# Altium integrated library EDD.IntLib: 140 symbols
Pins are listed as number, name and electrical type; pins without a type are passive.

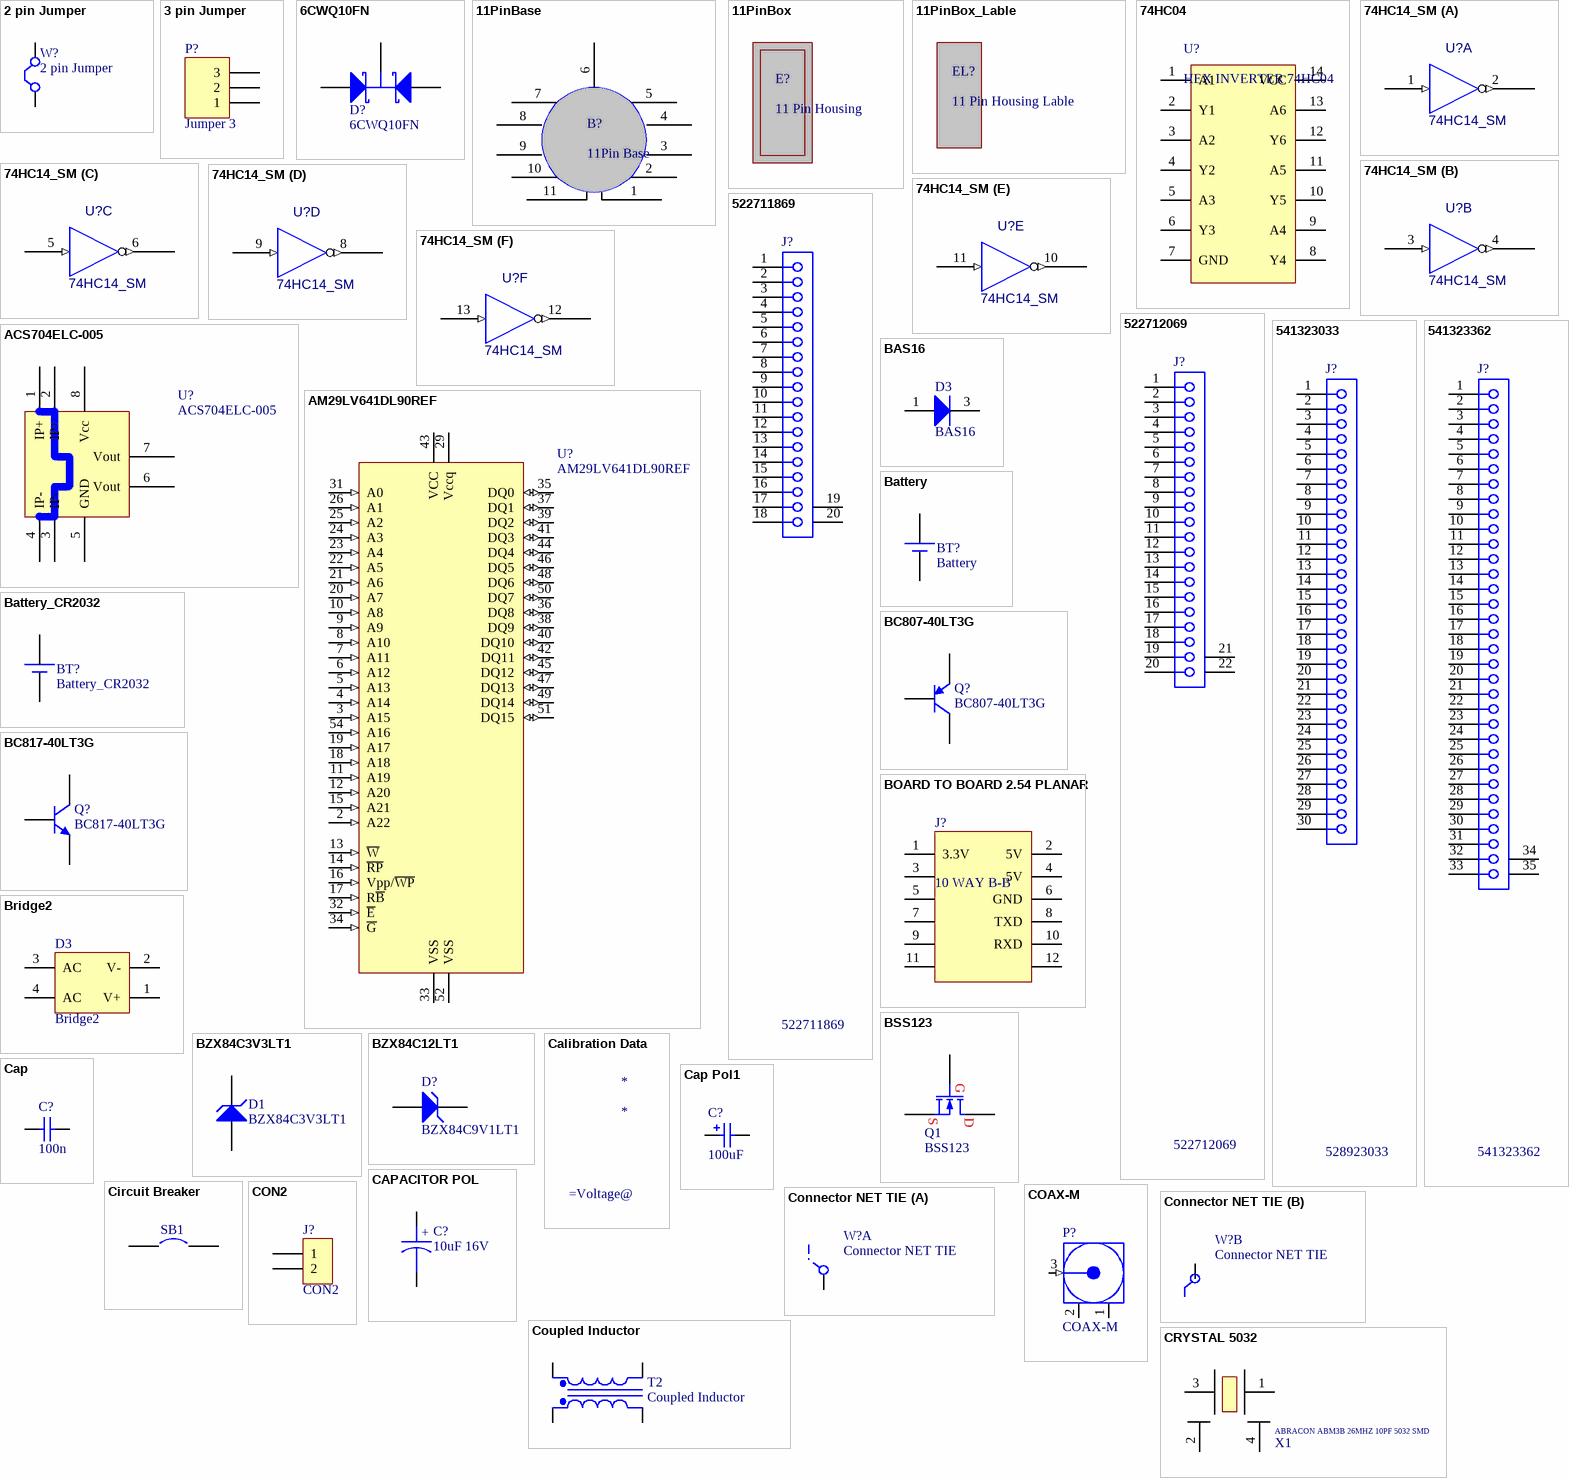
[diagram p0: symbols 2 pin Jumper to CRYSTAL 5032]

## 2 pin Jumper
designator W?
Jumper, 2 pin; Published: 24-Mar-1999; LatestRevisionDate: 17-Jul-2002; LatestRevisionNote: Re-released for DXP Platform.; PackageReference: RAD-0.2; Publisher: Altium Limited
footprint DDPAK-EB3_L (D2-PAK, 4-Leads, Body 9x10.2mm, Pitch 2.54mm, Lead Span 14.9mm, IPC High Density)
footprint 2 pin Jumper (Connector; Header; 2 Position)
pins: 1 C1, 2 C2

## 3 pin Jumper
designator P?, comment Jumper 3
Jumper, 3-Pin; LatestRevisionDate: 17-Jul-2002; LatestRevisionNote: Re-released for DXP Platform.; Publisher: Altium Limited
footprint 3 pin Jumper (Footprint not found)
signal-integrity model Connector
pins: 1, 2, 3

## 6CWQ10FN
designator D?
Schottky Rectifier; Note: Pin 2 is trimmed and not drawn; Published: 17-Sep-2003; DatasheetVersion: May-2002; PackageVersion: Feb-2003; PackageReference: TO-252AA; Publisher: Altium Limited; PackageDescription: 3-Pin HEXFET Package 2.28 mm Pitch, 9.9 mm Lead Span; Code_JEDEC: TO-252-AA; ComponentLink1Description: Manufacturer Link; ComponentLink1URL: http://www.irf.com/; ComponentLink2Description: Datasheet; ComponentLink2URL: http://www.irf.com/product-info/datasheets/data/6CWQ10FN.pdf
footprint TO-252AA_N (D-PAK, 4-Leads, Body 6.1x6.5mm, Pitch 2.28mm, Lead Span 9.9mm, IPC Medium Density)
footprint TO-252AA_L (D-PAK, 4-Leads, Body 6.1x6.5mm, Pitch 2.28mm, Lead Span 9.9mm, IPC High Density)
footprint TO-252AA_M (D-PAK, 4-Leads, Body 6.1x6.5mm, Pitch 2.28mm, Lead Span 9.9mm, IPC Low Density)
simulation model 6CWQ10FN (SUBCKT)
pins: 1 A1, 3 A2, 4 K

## 11PinBase
designator B?, comment 11Pin Base  (mechanical)
footprint 11PinBase (Footprint not found)
pins: 1, 2, 3, 4, 5, 6, 7, 8, 9, 10, 11

## 11PinBox
designator E?, comment 11 Pin Housing  (mechanical)
IsEnclosure: 1

## 11PinBox_Lable
designator EL?, comment 11 Pin Housing Lable  (mechanical)
InEnclosure: 1

## 74HC04
designator U?, comment HEX INVERTER 74HC04
HEX INVERTER
footprint SOIC14
pins: 1 A1 (oc), 2 Y1 (power), 3 A2 (power), 4 Y2 (power), 5 A3 (power), 6 Y3 (power), 7 GND (power), 8 Y4, 9 A4, 10 Y5 (power), 11 A5 (power), 12 Y6, 13 A6, 14 VCC

## 74HC14_SM
designator U?
Value: *
footprint QFN50P393X393X90_HS-17N (Footprint not found)
pins on every part: 7 GND (power) hidden to GND, 14 VCC (power) hidden to VCC
part A pins: 1 A (in), 2 Y (out)
part B pins: 3 A (in), 4 Y (out)
part C pins: 5 A (in), 6 Y (out)
part D pins: 8 Y (out), 9 A (in)
part E pins: 10 Y (out), 11 A (in)
part F pins: 12 Y (out), 13 A (in)

## 522711869
designator J?
FPC/FFC Connector, Right Angle, SMT, ZIF, Bottom Contact Style, 33 Position, Pitch 0.50mm (.020"), Lead-free; PCB_Layout: Complies with manufacturer's FFC recommendation.; Published: 30-May-2008; DatasheetVersion: Aug-2006; PackageVersion: revA, Feb-2004; PackageReference: 541325097; Publisher: Altium Limited; ComponentLink1Description: Manufacturer Link; ComponentLink1URL: http://www.molex.com/; ComponentLink2Description: Datasheet; ComponentLink2URL: http://www.molex.com/pdm_docs/ps/PS-54132-058.pdf; ComponentLink3Description: Packaging Specification; ComponentLink3URL: http://www.molex.com/pdm_docs/sd/541325097_sd.pdf
footprint 522711869 (1.00mm Pitch FFC/FPC Connector, Right Angle, SMT, ZIF, Bottom Contact Style, 18 Circuits, Lead-Free, Gold Contact Plating, High Barrier Packaging)
pins: 1, 2, 3, 4, 5, 6, 7, 8, 9, 10, 11, 12, 13, 14, 15, 16, 17, 18, 19 MH1, 20 MH2

## 522712069
designator J?
FPC/FFC Connector, Right Angle, SMT, ZIF, Bottom Contact Style, 33 Position, Pitch 0.50mm (.020"), Lead-free; PCB_Layout: Complies with manufacturer's FFC recommendation.; Published: 30-May-2008; DatasheetVersion: Aug-2006; PackageVersion: revA, Feb-2004; PackageReference: 541325097; Publisher: Altium Limited; ComponentLink1Description: Manufacturer Link; ComponentLink1URL: http://www.molex.com/; ComponentLink2Description: Datasheet; ComponentLink2URL: http://www.molex.com/pdm_docs/ps/PS-54132-058.pdf; ComponentLink3Description: Packaging Specification; ComponentLink3URL: http://www.molex.com/pdm_docs/sd/541325097_sd.pdf
signal-integrity model FPC-FFC
footprint 522712069 (1.00mm Pitch FFC/FPC Connector, Right Angle, SMT, ZIF, Bottom Contact Style, 20 Circuits, Lead-Free, Gold Contact Plating, High Barrier Packaging)
pins: 1, 2, 3, 4, 5, 6, 7, 8, 9, 10, 11, 12, 13, 14, 15, 16, 17, 18, 19, 20, 21 MH1, 22 MH2

## 541323033
designator J?, comment 528923033
FPC/FFC Connector, Right Angle, SMT, ZIF, Bottom Contact Style, 30 Position, Pitch 0.50mm (.020"), Lead-free; PCB_Layout: Complies with manufacturer's FFC recommendation.; Published: 30-May-2008; DatasheetVersion: Aug-2006; PackageVersion: revA, Feb-2004; PackageReference: 541325097; Publisher: Altium Limited; ComponentLink1Description: Manufacturer Link; ComponentLink1URL: http://www.molex.com/; ComponentLink2Description: Datasheet; ComponentLink2URL: http://www.molex.com/pdm_docs/ps/PS-54132-058.pdf; ComponentLink3Description: Packaging Specification; ComponentLink3URL: http://www.molex.com/pdm_docs/sd/541325097_sd.pdf
footprint 541323362 (Connector; FPC/FFC, SM, 50 Position, Right Angle, Pitch 0.50mm, Body 30.5x5.0mm (LxW), Bottom Contacts)
signal-integrity model FPC-FFC
pins: 1, 2, 3, 4, 5, 6, 7, 8, 9, 10, 11, 12, 13, 14, 15, 16, 17, 18, 19, 20, 21, 22, 23, 24, 25, 26, 27, 28, 29, 30

## 541323362
designator J?
FPC/FFC Connector, Right Angle, SMT, ZIF, Bottom Contact Style, 33 Position, Pitch 0.50mm (.020"), Lead-free; PCB_Layout: Complies with manufacturer's FFC recommendation.; Published: 30-May-2008; DatasheetVersion: Aug-2006; PackageVersion: revA, Feb-2004; PackageReference: 541325097; Publisher: Altium Limited; ComponentLink1Description: Manufacturer Link; ComponentLink1URL: http://www.molex.com/; ComponentLink2Description: Datasheet; ComponentLink2URL: http://www.molex.com/pdm_docs/ps/PS-54132-058.pdf; ComponentLink3Description: Packaging Specification; ComponentLink3URL: http://www.molex.com/pdm_docs/sd/541325097_sd.pdf
footprint 541323362 (Connector; FPC/FFC, SM, 50 Position, Right Angle, Pitch 0.50mm, Body 30.5x5.0mm (LxW), Bottom Contacts)
signal-integrity model FPC-FFC
pins: 1, 2, 3, 4, 5, 6, 7, 8, 9, 10, 11, 12, 13, 14, 15, 16, 17, 18, 19, 20, 21, 22, 23, 24, 25, 26, 27, 28, 29, 30, 31, 32, 33, 34 MH1, 35 MH2

## ACS704ELC-005
designator U?
Code: Q25937
footprint SOIC8 (Footprint not found)
pins: 1 IP+, 2 IP+, 3 IP-, 4 IP-, 5 GND, 6 Vout, 7 Vout, 8 Vcc

## AM29LV641DL90REF
designator U?
64 Mb (4 M x 16) CMOS 3.0 Volt, Uniform Sector Flash Memory with VersatileI/O Control, 48-Pin TSOP, Industrial Grade, Pb-free; Published: 6-Jun-2005; LatestRevisionDate: 06-Oct-2005; LatestRevisionNote: Schematic layout and Library name changed.; DatasheetVersion: Feb-2005; PackageVersion: revAA, 10/99; PackageReference: TS048; Publisher: Altium Limited; PackageDescription: Shrink Small Outline; 48 Leads; Body Width 18.4 mm; Pitch 0.5 mm; Code_JEDEC: MO-142-DD; ComponentLink1Description: Manufacturer Link; ComponentLink1URL: http://www.spansion.com/; ComponentLink2Description: Datasheet; ComponentLink2URL: http://www.spansion.com/datasheets/22366c3.pdf
footprint TSSOP50P2000X120-56N (Footprint not found)
pins: 2 A22 (in), 3 A15 (in), 4 A14 (in), 5 A13 (in), 6 A12 (in), 7 A11 (in), 8 A10 (in), 9 A9 (in), 10 A8 (in), 11 A19 (in), 12 A20 (in), 13 ~{W} (in), 14 ~{RP} (in), 15 A21 (in), 16 Vpp/~{WP} (in), 17 R~{B} (in), 18 A18 (in), 19 A17 (in), 20 A7 (in), 21 A6 (in), 22 A5 (in), 23 A4 (in), 24 A3 (in), 25 A2 (in), 26 A1 (in), 29 Vccq (power), 31 A0 (in), 32 ~{E} (in), 33 VSS (power), 34 ~{G} (in), 35 DQ0 (io), 36 DQ8 (io), 37 DQ1 (io), 38 DQ9 (io), 39 DQ2 (io), 40 DQ10 (io), 41 DQ3 (io), 42 DQ11 (io), 43 VCC (power), 44 DQ4 (io), 45 DQ12 (io), 46 DQ5 (io), 47 DQ13 (io), 48 DQ6 (io), 49 DQ14 (io), 50 DQ7 (io), 51 DQ15 (io), 52 VSS (power), 54 A16 (in)

## BAS16
designator D3
Switching Diode; Text Field6: Pin 2 is not connected and not drawn.; Text Field7: Published 29-Sep-2000
footprint SO-G3/C2.5
pins: 1 A, 3 K

## Battery
designator BT?
Singlecell Battery; Published: 24-Mar-1999; LatestRevisionDate: 17-Jul-2002; LatestRevisionNote: Re-released for DXP Platform.; PackageReference: BAT-2; Publisher: Altium Limited
footprint BC501SM (Coin cell holder 12mm)
footprint LIR-2450 (Footprint not found)
pins: 1 +, 2 -

## Battery_CR2032
designator BT?
Singlecell Battery; Published: 24-Mar-1999; LatestRevisionDate: 17-Jul-2002; LatestRevisionNote: Re-released for DXP Platform.; PackageReference: BAT-2; Publisher: Altium Limited
footprint CR2032 Battery Holder (Footprint not found)
pins: 1 +, 2 -, 3 +

## BC807-40LT3G
designator Q?
General Purpose Transistor PNP Silicon; Published: 29-Sep-2000; LatestRevisionDate: 17-Jul-2002; LatestRevisionNote: Re-released for DXP Platform.; DatasheetVersion: 1997; PackageVersion: 1997; PackageReference: 318-08; Publisher: Altium Limited; PackageDescription: SOT-23; 3 Leads; Body 3.0 x 2.6 mm, inc. leads (LxW max); ComponentLink1Description: Manufacturer Link; ComponentLink1URL: http://www.onsemi.com/site/products/landing?taxonomyID=194; ComponentLink2Description: Datasheet; ComponentLink2URL: http://www.onsemi.com/pub/Collateral/BC856ALT1-D.PDF
footprint SO-G3/Z3.3
pins: 1 B, 2 E, 3 C

## BC817-40LT3G
designator Q?
General Purpose Transistor NPN Silicon; Published: 29-Sep-2000; LatestRevisionDate: 17-Jul-2002; LatestRevisionNote: Re-released for DXP Platform.; DatasheetVersion: 1997; PackageVersion: 1997; PackageReference: 318-08; Publisher: Altium Limited; PackageDescription: SOT-23; 3 Leads; Body 3.0 x 2.6 mm, inc. leads (LxW max); ComponentLink1Description: Manufacturer Link; ComponentLink1URL: http://www.onsemi.com/site/products/landing?taxonomyID=194; ComponentLink2Description: Datasheet; ComponentLink2URL: http://www.onsemi.com/pub/Collateral/BC846ALT1-D.PDF
footprint SO-G3/Z3.3
pins: 1 B, 2 E, 3 C

## BOARD TO BOARD 2.54 PLANAR
designator J?, comment 10 WAY B-B
Connector; Code: CON2
footprint HOUSED SOCKET 2 X 6 WAY SIL
pins: 1 3.3V, 2 5V, 3, 4 5V, 5, 6 GND, 7, 8 TXD, 9, 10 RXD, 11, 12

## Bridge2
designator D3
Diode Bridge; Published: 24-Mar-1999; LatestRevisionDate: 17-Jul-2002; LatestRevisionNote: Re-released for DXP Platform.; PackageReference: D-46_6A; Publisher: Altium Limited
footprint E-BIP-P4/X2.1 (Bridge Rectifier; 4 Terminals; Body 16.8 x 16.8 mm (typ); Pitch 10.67 mm)
simulation model BRIDGE (Spice Subcircuit)
footprint DB-1S (CFP, 4-Leads, Body 8.1x6.3mm (max), Pitch 4.66mm, IPC Medium Density)
pins: 1 V+, 2 V-, 3 AC, 4 AC

## BSS123
designator Q1
BSS123; MANTECH PART NUMBER 35M2919; Published: 8-Jun-2000; LatestRevisionDate: 17-Jul-2002; LatestRevisionNote: Re-released for DXP Platform.; PackageVersion: 1995/1996; PackageReference: E3; Publisher: Altium Limited; PackageDescription: TO, Flat Index; 3 In-Line, Axial Leads; Body Dia. 4.6mm; Lead Dia. 0.5 mm (max)
footprint SOT23
pins: 1 D, 2 G, 3 S

## BZX84C3V3LT1
designator D1
Zener Voltage Regulator Diode; Note: Pin 2 is not connected and not drawn.; Published: 29-Sep-2000; LatestRevisionDate: 17-Jul-2002; LatestRevisionNote: Re-released for DXP Platform.; PackageReference: 318-07; Publisher: Altium Limited; PackageDescription: SOT-23; 3 Leads; Body 3.0 x 2.5 mm, inc. leads (LxW max); ComponentLink1Description: Manufacturer Link; ComponentLink1URL: http://www.onsemi.com/site/products/landing?taxonomyID=194; ComponentLink2Description: Datasheet; ComponentLink2URL: http://www.onsemi.com/pub/Collateral/BZX84C2V4LT1-D.PDF
footprint SO-G3/Z3.3
pins: 1 A, 3 K

## BZX84C12LT1
designator D?, comment BZX84C9V1LT1
Zener Voltage Regulator Diode; Manufacturer: Motorola; Class: Discrete; SubClass: Diode - Zener; Note: Pin 2 is not connected and not drawn.; Code: PED680LX; Published: 29/09/2000; Publisher: Altium Hobart Technology Centre
footprint SO-G3/Z3.3 (SOT-23; 3 Leads; Body 3.0 x 2.5 mm, inc. leads (LxW max))
pins: 1 A, 3 K

## Calibration Data
designator *

## Cap
designator C?, comment 100n
Capacitor; Code: AAK338; Published: 8-Jun-2000; Revision: July-2002: Re-released for DXP Platform.; Publisher: Altium Limited
footprint 0603
footprint 1206
footprint CAPPA13-24x31.5 (Capacitor, Radial,)
footprint RAD-0.6 (Footprint not found)
footprint RAD-0.4 (Footprint not found)
footprint CAPC0402(1005)60_L (Chip Capacitor, Body 1.0x0.5mm, Height 0.6mm, IPC High Density)
footprint CAPC0402(1005)60_N (Chip Capacitor, Body 1.0x0.5mm, Height 0.6mm, IPC Medium Density)
footprint Capacitor Tant / Poly 2.54mm (Capacitor Thru Hole)
pins: 1, 2

## Cap Pol1
designator C?, comment 100uF
TAJD/100MFD/10%/10V/TANT/SMD; Unit P: 1.02; Published: 8-Jun-2000; LatestRevisionDate: 17-Jul-2002; LatestRevisionNote: Re-released for DXP Platform.; Publisher: Altium Limited; Supplier1 Code: ADB690LX; Supplier1: Avnet
footprint TC7360-2924 (Capacitor, SM Tantalum; Body 7.3 x 6.0 mm (LxW typ))
pins: 1, 2
1 alternate drawing of the same symbol

## CAPACITOR POL
designator C?, comment 10uF 16V
Capacitor; Code: ALA535
footprint Cap SMD4-5*5.5 (Rubicon 4-5*5.5)
footprint Cap SMD6.3-8*6.5 (Rubicon 6.3-8*6.5)
footprint Cap SMD8-10*10.5 - duplicate (Rubicon 8-10*10.5)
footprint Cap SMD3*5.5
footprint CAP SMD12.5*13.5
footprint RB7.6-15 (Polarized Capacitor (Radial); 2 Leads)
footprint Cap SMD6.3*8
footprint RB5-10.5 (Motor, General Kind; 2 Leads)
footprint Cap SMD8-10*10.5 (Rubicon 8-10*10.5)
footprint RB30-30
pins: 1, 2
text: +

## Circuit Breaker
designator SB1
Circuit Breaker; Published: 24-Mar-1999; Revision: July-2002: Re-released for DXP Platform.; Publisher: Altium Limited
footprint JP2_SMD
pins: 1, 2

## COAX-M
designator P?
RF Coaxial PCB Connector, MMCX; Thru-Hole, Vertical Mount Plug,  50 Ohm Impedance; PackageDocument: Rev. A, 16-Jun-1997; PCB_Layout: Complies with manufacturer's recommendation.; DrillSize: Corresponds to nominal value.; Published: 15-Jul-2004; LatestRevisionDate: 15-Jul-2004; LatestRevisionNote: Component Replaced.; DatasheetDocument: 30-May-2003; PackageReference: 908-21103; Publisher: Altium Limited; ComponentLink1Description: Manufacturer Link; ComponentLink1URL: http://www.amphenolrf.com/
footprint U.FL-R-SMT (Footprint not found)
pins: 1 GND (power), 2 GND (power), 3 Signal (in) "Signal Pin"

## CON2
designator J?
Connector; Code: CON2
footprint COUPLED INDUCTOR (Footprint not found)
pins: 1, 2

## Connector NET TIE
designator W?  (net tie)
Published: 24-Mar-1999; LatestRevisionDate: 17-Jul-2002; LatestRevisionNote: Re-released for DXP Platform.; PackageReference: RAD-0.2; Publisher: Altium Limited
footprint Connector NET TIE (Footprint not found)
part A pins: 1 C1
part B pins: 2 C2

## Coupled Inductor
designator T2
footprint Coupled Inductor
pins: 1 Sec+, 2 Pri+, 3 Pri-, 4 Sec-

## CRYSTAL 5032
designator X1, comment ABRACON ABM3B 26MHZ 10PF 5032 SMD
CRYSTAL 5032
footprint CRYSTAL 5032 (CRYSTAL xxx MHZ)
footprint CRYSTAL 3225 (Footprint not found)
pins: 1, 2, 3, 4

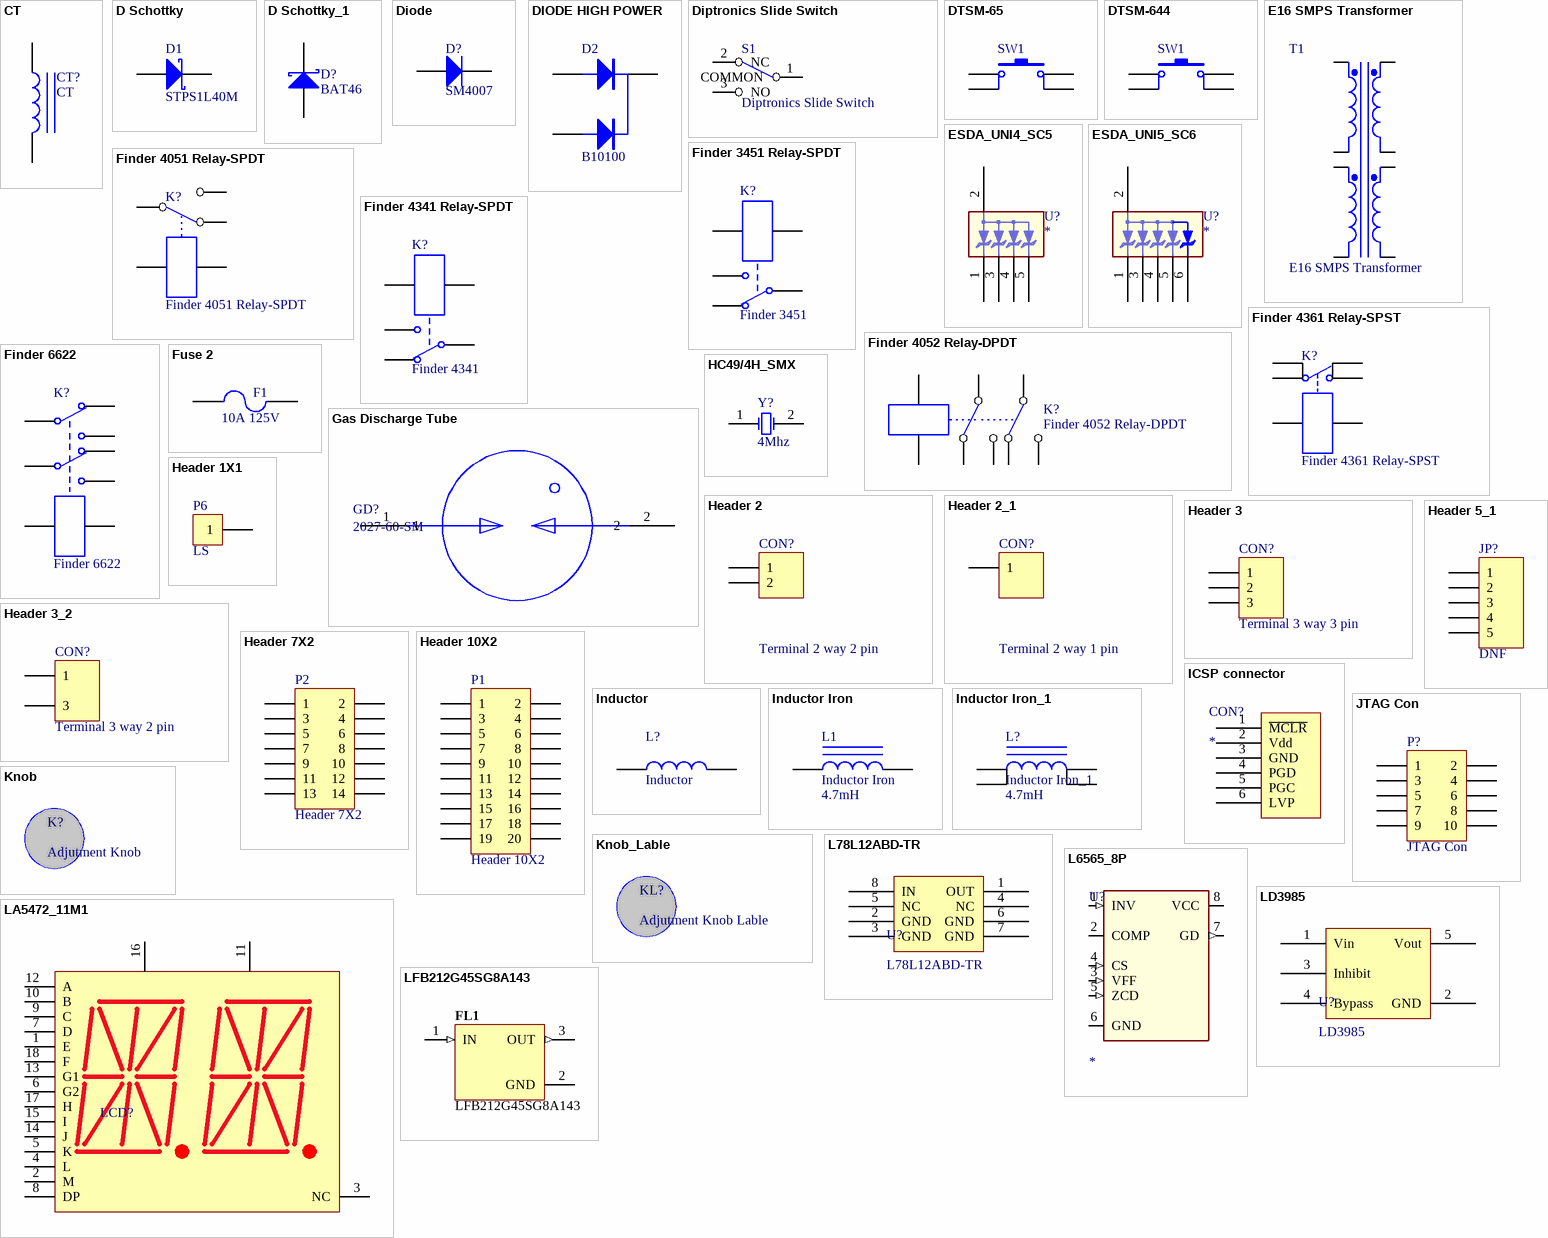
[diagram p1: symbols CT to LFB212G45SG8A143]

## CT
designator CT?
Current Transformer
footprint TC1V (Footprint not found)
pins: 1, 2

## D Schottky
designator D1, comment STPS1L40M
Schottky Diode; Published: 8-Jun-2000; LatestRevisionDate: 17-Jul-2002; LatestRevisionNote: Re-released for DXP Platform.; PackageReference: SMB; Publisher: Altium Limited; PackageDescription: DO-214-AA/SMB; 2 C-Bend Leads; Body 5.3 x 3.6 mm, inc. leads (LxW); Code_JEDEC: DO-214-AA
footprint SMB (DO-214-AA/SMB; 2 C-Bend Leads; Body 5.3 x 3.6 mm, inc. leads (LxW))
simulation model SKYDIODE (Diode)
signal-integrity model D Schottky
footprint 425
pins: 1 A, 2 K

## D Schottky_1
designator D?, comment BAT46
BAT46JFILM; Published: 8-Jun-2000; LatestRevisionDate: 17-Jul-2002; LatestRevisionNote: Re-released for DXP Platform.; PackageReference: SMB; Publisher: Altium Limited; Code_JEDEC: DO-214-AA
footprint SOD323 (Footprint not found)
footprint SOD-1323 (SOD-123 and SOD232 combined)
pins: 1 A, 2 K

## Diode
designator D?, comment SM4007
Default Diode; Code - JEDEC: DO-214-AB; Code: QBJ105; Published: 8-Jun-2000; Revision: July-2002: Re-released for DXP Platform.; Publisher: Altium Limited
footprint DSO-C2/X3.3 (DO-214-AB/SMC; 2 C-Bend Leads; Body 7.9 x 5.9 mm, inc. leads (LxW))
footprint DSO-C2/X2.3
pins: 1 A, 2 K

## DIODE HIGH POWER
designator D2, comment B10100
Diode; Part Number: SM4007; PartCategory: B; Code: QBJ105; Company Code: 0515; Long Description: RECTIFIER 1000V 1A MELF SM-1(LEAD FREE); AlternateKey2: QBJ105LX; ProductClass: SR1; BulkIssueFlag: N; WarehouseToUse: M; Unit P: 7.70; Type: SMD; Value: SM4007; Designator: D?; Stock Code: QBJ105; Price: 0.17; StockUom: EA; PriceCatewgory: A; Supplier1: Mantech; Supplier1 Code: MURHD560T4; Pin Count: 2; Footprint: DSO-C2/G1.6; PackageReference: DSO-C2/G1.6
footprint DDPAK-EB3_L (D2-PAK, 4-Leads, Body 9x10.2mm, Pitch 2.54mm, Lead Span 14.9mm, IPC High Density)
pins: 1, 2, 3

## Diptronics Slide Switch
designator S1
footprint Diptronics Slide Switch (Footprint not found)
pins: 1 COMMON, 2 NC, 3 NO

## DTSM-65
designator SW1
footprint DTSM-65 (Footprint not found)
pins: 1, 2, 3, 4

## DTSM-644
designator SW1
footprint DTSM-644 (Footprint not found)
pins: 1, 2, 3, 4

## E16 SMPS Transformer
designator T1
Three-winding Transformer (Non-Ideal); Sim Note: Enter the turns ratios, Core loss resistance, Magnetising Reactance, Leakage Reactances and Resistances referred to the primary side into the parameter fields.; Published: 25-Jan-2001; LatestRevisionDate: 17-Jul-2002; LatestRevisionNote: Re-released for DXP Platform.; PackageReference: TRF_6; Publisher: Altium Limited
footprint E16 SMPS Transformer (Footprint not found)
pins: 1 Pri+, 2 Pri-, 3 Sec3+, 4 Sec3-, 5 Sec2-, 6 Sec2+, 7 Sec1-, 8 Sec1+

## ESDA_UNI4_SC5
designator U?
ESDA6V1W6
footprint SOT323-5L (SOT23, 6-Leads, Body 2.2x2.4mm (max), Pitch 0.65mm, IPC Medium Density)
pins: 1 P1, 2 CLAMP1, 3 P2, 4 P3, 5 P4

## ESDA_UNI5_SC6
designator U?
ESDA6V1W6
footprint SOT323-6L (Footprint not found)
pins: 1 P1, 2 CLAMP1, 3 P2, 4 P3, 5 P4, 6 P5

## Finder 3451 Relay-SPDT
designator K?, comment Finder 3451
Single-Pole Dual-Throw Relay; Published: 24-Mar-1999; Revision: July-2002: Re-released for DXP Platform.; Publisher: Altium Limited
footprint Finder 3451
pins: 1, 2, 3, 4, 5

## Finder 4051 Relay-SPDT
designator K?
Single-Pole Dual-Throw Relay; Code: FR42902
footprint Finder 4051
footprint Finder3022
pins: 1, 2, 4, 6, 8

## Finder 4052 Relay-DPDT
designator K?
Double-Pole Dual-Throw Relay
footprint Finder 4052
footprint Finder3022
pins: 1, 2, 3, 4, 5, 6, 7, 8

## Finder 4341 Relay-SPDT
designator K?, comment Finder 4341
Single-Pole Dual-Throw Relay; Published: 24-Mar-1999; Revision: July-2002: Re-released for DXP Platform.; Publisher: Altium Limited
footprint Finder 4341
pins: 1, 2, 3, 4, 5

## Finder 4361 Relay-SPST
designator K?
Single-Pole Single-Throw Relay; Published: 24-Mar-1999; LatestRevisionDate: 17-Jul-2002; LatestRevisionNote: Re-released for DXP Platform.; PackageReference: MODULE4; Publisher: Altium Limited; Code: RELAY-SPST
footprint Finder 4361
pins: 1, 2, 3, 4, 5, 6

## Finder 6622
designator K?
Dual-Pole Dual-Throw Relay; Published: 24-Mar-1999; LatestRevisionDate: 17-Jul-2002; LatestRevisionNote: Re-released for DXP Platform.; PackageReference: DIP-P8; Publisher: Altium Limited
footprint Finder 6622 (Finder 6622 30A Relay)
pins: 1, 2, 3, 4, 5, 6, 7, 8, 9, 10, 11, 12, 13, 14, 15, 16

## Fuse 2
designator F1, comment 10A 125V
10A 125V Littelfuse 0251010 Fuse; Published: 8-Jun-2000; LatestRevisionDate: 17-Jul-2002; LatestRevisionNote: Re-released for DXP Platform.; PackageReference: PIN-W2/E2.8; Publisher: Altium Limited
footprint Fuse (Footprint not found)
footprint MINI BLADE FUSE (Mini Blade Fuse & Holder 7.5A)
pins: 1, 2

## Gas Discharge Tube
designator GD?, comment 2027-60-SM
footprint 2027-60-SM (Gas Discharge TUbe)
pins: 1, 2

## HC49/4H_SMX
designator Y?, comment 4Mhz
4MegaHertz Surface Mount Quartz Crystal; Note: PCB layout complies with manufacturer's recommendation.; Unit P: 1.49; Published: 17-Jul-2002; DatasheetDocument: 18-Oct-1999; PackageDocument: 18-Oct-1999; PackageReference: HC49/4H_SMX; Publisher: Altium Limited; ComponentLink1Description: Manufacturer Link; ComponentLink1URL: http://www.cmac.com/mt/; ComponentLink2Description: Datasheet; ComponentLink2URL: http://www.cmac.com/mt/databook/crystals/smd/hc49_4h_smx.pdf; Supplier1 Code: ATP580; Supplier1: Avnet
footprint HC49/4H_SMX (Surface Mount Quartz Crystal; Body 13.4 (inc. leads) x 4.9 mm (LxW max))
pins: 1 OSC1, 2 OSC2

## Header 1X1
designator P6, comment LS
Header, 1-Pin; Note: 1/20; LatestRevisionDate: 17-Jul-2002; LatestRevisionNote: Re-released for DXP Platform.; Publisher: Altium Limited; SupplierName: GM Electronic; SupplierOrderCode: 832-017 (S1G20); SupplierPrice: 3.24; SupplierPriceUnit: CZK
footprint HDR1X1 (Connector; Header; 1 Position)
3D model HDR1X1 (PCB3D Model)
footprint HDR1X1 (Footprint not found)
pins: 1

## Header 2
designator CON?, comment Terminal 2 way 2 pin
Header, 2-way, 2-Pin; Code: DNF; Revision: 17-Jul-2002: Re-released for DXP Platform.; Publisher: Altium Limited
footprint MRT20 Connector 2way
footprint POWER2
footprint 2 way Terminal 5.08mm
footprint HDR1X2 (Footprint not found)
pins: 1, 2

## Header 2_1
designator CON?, comment Terminal 2 way 1 pin
Header, 2-way, 1-Pin; Code: DNF; Revision: 17-Jul-2002: Re-released for DXP Platform.; Publisher: Altium Limited
footprint MRT20 Connector 2way 1pin
footprint POWER2
footprint 2 way Terminal 5.08mm
pins: 1

## Header 3
designator CON?, comment Terminal 3 way 3 pin
Header, 3-way, 3-Pin; Code: DNF; LatestRevisionDate: 17-Jul-2002; LatestRevisionNote: Re-released for DXP Platform.; Publisher: Altium Limited
footprint MRT20 Connector 3way
footprint Power3
footprint 3 way Terminal 5.08mm
footprint HDR1X3 (Footprint not found)
pins: 1, 2, 3

## Header 3_2
designator CON?, comment Terminal 3 way 2 pin
Header, 3-way, 2-Pin; Code: DNF; LatestRevisionDate: 17-Jul-2002; LatestRevisionNote: Re-released for DXP Platform.; Publisher: Altium Limited
footprint MRT20 Connector 3way 2pin
footprint Power3
footprint 3 way Terminal 5.08mm
pins: 1, 3

## Header 5_1
designator JP?, comment DNF
Header, 5-Pin; Revision: 17-Jul-2002: Re-released for DXP Platform.; Publisher: Altium Limited; Code: DNF
footprint TC2030-MCP_NL
footprint HDR1X5 (Connector; Header; 5 Position)
footprint MRT20 Connector 5way (Connector; Header; 5 Position)
pins: 1, 2, 3, 4, 5

## Header 7X2
designator P2
Header, 7-Pin, Dual row; LatestRevisionDate: 17-Jul-2002; LatestRevisionNote: Re-released for DXP Platform.; Publisher: Altium Limited
footprint DIP14 Connector
signal-integrity model Connector
pins: 1, 2, 3, 4, 5, 6, 7, 8, 9, 10, 11, 12, 13, 14

## Header 10X2
designator P1
Header, 10-Pin, Dual row; LatestRevisionDate: 17-Jul-2002; LatestRevisionNote: Re-released for DXP Platform.; Publisher: Altium Limited
footprint DIP20 Connector (Footprint not found)
signal-integrity model Connector
pins: 1, 2, 3, 4, 5, 6, 7, 8, 9, 10, 11, 12, 13, 14, 15, 16, 17, 18, 19, 20

## ICSP connector
designator CON?
footprint TC2030-MCP_NL
pins: 1 ~{MCLR}, 2 Vdd, 3 GND, 4 PGD, 5 PGC, 6 LVP

## Inductor
designator L?
Inductor Bead; Value: 10mH; Published: 24-Mar-1999; LatestRevisionDate: 17-Jul-2002; LatestRevisionNote: Re-released for DXP Platform.; PackageReference: AXIAL-0.9; Publisher: Altium Limited; PackageDescription: Axial Device, Thru-Hole; 2 Leads; 0.9 in Pin Spacing
simulation model INDUCTOR (Inductor)
signal-integrity model Inductor Iron
footprint 0603
footprint INDP3030X14N (Footprint not found)
pins: 1, 2

## Inductor Iron
designator L1  value 4.7mH
Magnetic-Core Inductor; Published: 24-Mar-1999; LatestRevisionDate: 17-Jul-2002; LatestRevisionNote: Re-released for DXP Platform.; PackageReference: AXIAL-0.9; Publisher: Altium Limited; PackageDescription: Axial Device, Thru-Hole; 2 Leads; 0.9 in Pin Spacing
simulation model INDUCTOR (Inductor)
signal-integrity model Inductor Iron
footprint 1206
footprint INDP3030X14N (Precision Wire Wound Inductor, 2-Leads, Body 3.00x3.00mm, IPC Medium Density)
footprint Bourns 1006 (Footprint not found)
pins: 1, 2

## Inductor Iron_1
designator L?  value 4.7mH
Magnetic-Core Inductor; Published: 24-Mar-1999; LatestRevisionDate: 17-Jul-2002; LatestRevisionNote: Re-released for DXP Platform.; PackageReference: AXIAL-0.9; Publisher: Altium Limited; PackageDescription: Axial Device, Thru-Hole; 2 Leads; 0.9 in Pin Spacing
footprint ETD29
footprint EF25 Vertical Transformer
pins: 1, 2, 4, 5

## JTAG Con
designator P?
Header, 5-Pin, Dual row; LatestRevisionDate: 17-Jul-2002; LatestRevisionNote: Re-released for DXP Platform.; Publisher: Altium Limited
footprint FTSH-105-01-DV-K
signal-integrity model Connector
footprint FTSH-105-04-L-D
pins: 1, 2, 3, 4, 5, 6, 7, 8, 9, 10

## Knob
designator K?, comment Adjutment Knob  (mechanical)

## Knob_Lable
designator KL?, comment Adjutment Knob Lable  (mechanical)

## L78L12ABD-TR
designator U?
footprint SOIC8
pins: 1 OUT, 2 GND, 3 GND, 4 NC, 5 NC, 6 GND, 7 GND, 8 IN

## L6565_8P
designator U?
footprint SOIC8
pins: 1 INV (in), 2 COMP, 3 VFF (in), 4 CS (in), 5 ZCD (in), 6 GND (power), 7 GD (out), 8 VCC (power)

## LA5472_11M1
designator LCD?, comment LA5472  (value not drawn)
footprint LA5472 (Footprint not found)
pins: 1 E, 2 M, 3 NC, 4 L, 5 K, 6 G2, 7 D, 8 DP, 9 C, 10 B, 11 Digit2, 12 A, 13 G1, 14 J, 15 I, 16 Digit1, 17 H, 18 F

## LD3985
designator U?
footprint SOT323-5L (SOT23, 6-Leads, Body 2.2x2.4mm (max), Pitch 0.65mm, IPC Medium Density)
pins: 1 Vin, 2 GND, 3 Inhibit, 4 Bypass, 5 Vout

## LFB212G45SG8A143
designator FL1
LFB21(0805)_SG Series Filter for Wireless LAN/Bluetooth, 2400-2500 MHz, 2 x 1.25 x 0.95 mm; Manufacturer: Murata; Attenuation (Absolute Value) II) (dB): 30 min. at 1710~1990MHz; Nominal Center Frequency (fo): 2450 MHz; Attenuation (Absolute Value) I) (dB): 20 min. at 880-1710 MHz; Insertion Loss in BW (dB) max: 2.7; Packing: Tape and Reel; Bandwidth (BW): 2450 +/-50MHz; ComponentLink1Description: Manufacturer URL; DatasheetVersion: Dec-10; ComponentLink3Description: Package Specification; ComponentLink1URL: http://www.murata.com/; PartNumber: LFB212G45SG8A143; Mounting Technology: Surface Mount; PackageDescription: 4-Pin Hand drawn, Body 2x1.25mm; ComponentLink2Description: Datasheet; PackageReference: LFB212G45SG8A143-4; ComponentLink2URL: http://www.murata.com/products/catalog/pdf/k99/k99e_l0270.pdf; ComponentLink3URL: http://search.murata.co.jp/Ceramy/CatalogAction.do?sHinnm=?%C2%A0&sNHinnm=LFB212G45SG8A143&sNhin_key=LFB212G45SG8A143&sLang=en&sParam=LFB21
footprint MUR-LFB212G45SG8A143-4
pins: 1 IN (in), 2 GND (power), 3 OUT (out)

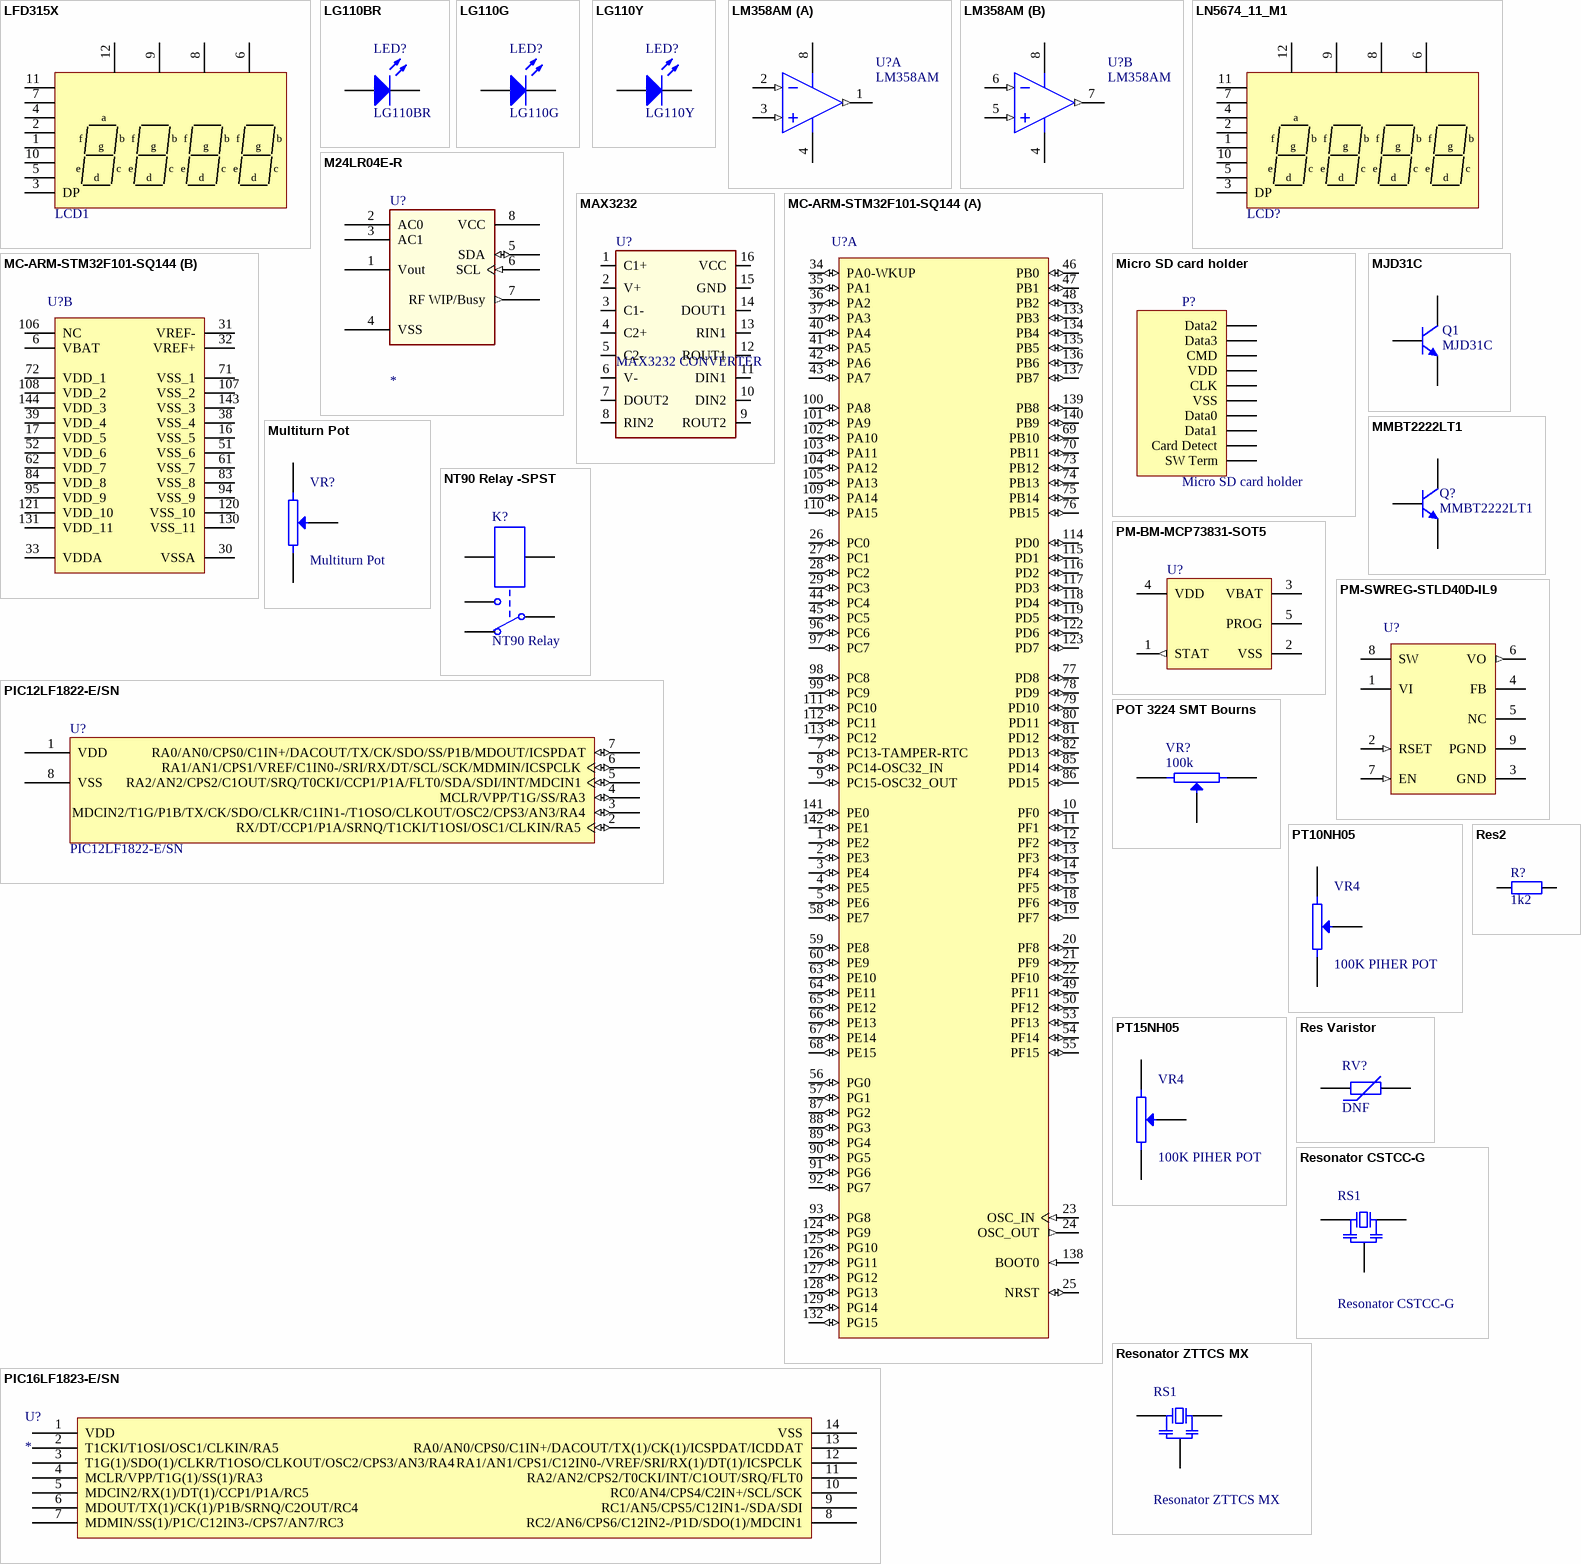
[diagram p2: symbols LFD315X to Resonator ZTTCS MX]

## LFD315X
designator LCD1  (value not drawn)
footprint LFD315x (Footprint not found)
pins: 1 e, 2 d, 3 DP, 4 c, 5 g, 6 Digit4, 7 b, 8 Digit3, 9 Digit2, 10 f, 11 a, 12 Digit1

## LG110BR
designator LED?
LED right angle SMD; Unit P: 0.30; Supplier1 Code: LG110G-CT; Supplier1: Avent
footprint LG110BR (Footprint not found)
pins: 1 A, 2 K

## LG110G
designator LED?
LED right angle SMD; Unit P: 0.30; Supplier1 Code: LG110G-CT; Supplier1: Avent
footprint LG110G (Footprint not found)
pins: 1 A, 2 K

## LG110Y
designator LED?
LED right angle SMD; Unit P: 0.30; Supplier1 Code: LG110G-CT; Supplier1: Avent
footprint LG110Y (Footprint not found)
pins: 1 A, 2 K

## LM358AM
designator U?
Low Power Dual Operational Amplifier; Manufacturer: National Semiconductor; CompType: Amplifiers; PackageTopMarking: NSZXTT*LM*358AM; Published: 4-Dec-2008; LatestRevisionDate: 13-Jan-2009; LatestRevisionNote: Sim Model Added.; DatasheetVersion: Oct-2005; PackageVersion: revL, Sep-2006; PackageReference: M08A; Publisher: Altium Limited; PackageDescription: SOIC Narrow, 4.9 x 3.9 x 1.45mm, 8 Lead, 1.27mm Pitch; PartNumber: LM358AM; RoHS: O; PinCount: 8; DigiKeyPartNumber: LM358AMXCT-ND; Code_JEDEC: MS-012-AA; Code_IPC: SOIC127P600-8; ComponentLink1Description: LM358 Datasheet; ComponentLink1URL: http://www.national.com/ds/LM/LM358.pdf; ComponentLink2Description: LM358 Web Page; ComponentLink2URL: http://www.national.com/pf/LM/LM358.html; ComponentLink3Description: M08A Package Page; ComponentLink3URL: http://www.national.com/packaging/folders/m08a.html
simulation model LM358 (SUBCKT)
footprint SOIC8
pins on every part: 4 GND (power), 8 V+ (power)
part A pins: 1 OUTA (out), 2 INA- (in), 3 INA+ (in)
part B pins: 5 INB+ (in), 6 INB- (in), 7 OUTB (out)
